# Altium footprint library CustomCase.PcbLib: 268 footprints (part 6 of 17)
Each footprint in its own frame and in the unit in brackets; x right, y up, seen from the top. Pads: shape width x height; smd on the part's side, far side on the other; paste and mask are expansions set on the pad; w line width, h text height; cw(c..) or ccw(c..) is an arc to the next point about the centre after c.
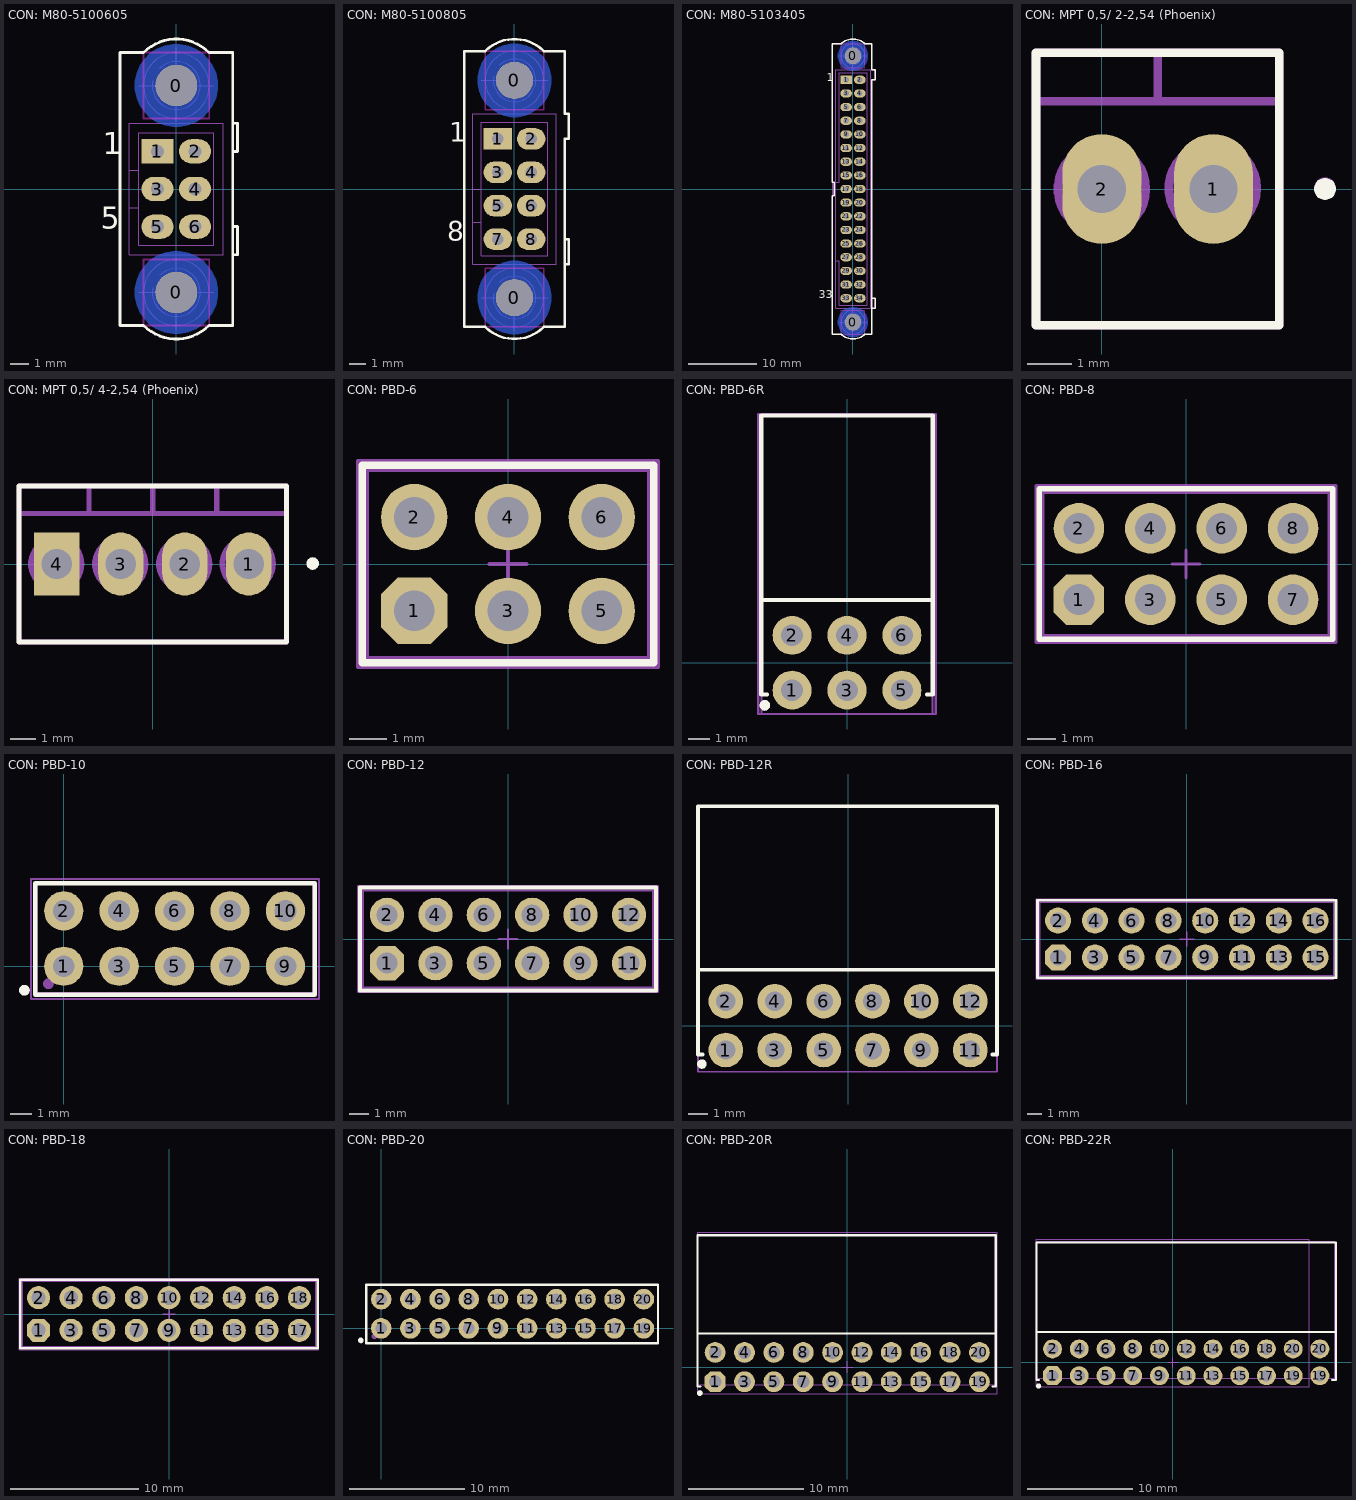
[diagram p5: the footprints below, top view; thin cyan lines are the x and y axes]

## CON: M80-5100605 [mm] "6 pin; Harwin"
height 5.5
pads (8):
  round 2.2 hole 2.2 unplated: 0(0,-5.5) 0(0,5.5)
  rect 1.7x1.3 hole 0.7: 1(-1,2)
  oval 1.7x1.3 hole 0.7: 2(1,2) 3(-1,0) 4(1,0) 5(-1,-2) 6(1,-2)
Top Layer keep-out:
  lines w0.1: -1.75,-7.25 1.75,-7.25 1.75,-3.75 -1.75,-3.75 -1.75,-7.25 ; -1.75,3.75 -1.75,7.25 1.75,7.25 1.75,3.75 -1.75,3.75
Bottom Layer:
  pour cut-out: 2.2,-5.5 2.2,-5.283 2.115,-4.858 1.95,-4.458 1.709,-4.098 1.402,-3.791 1.042,-3.55 0.642,-3.385 0.217,-3.3 -0.217,-3.3 -0.642,-3.385 -1.042,-3.55 -1.402,-3.791 -1.709,-4.098 -1.95,-4.458 -2.115,-4.858 -2.2,-5.283 -2.2,-5.5 -2.2,-5.717 -2.115,-6.142 -1.95,-6.542 -1.709,-6.902 -1.402,-7.209 -1.042,-7.45 -0.642,-7.615 -0.217,-7.7 0.217,-7.7 0.642,-7.615 1.042,-7.45 1.402,-7.209 1.709,-6.902 1.95,-6.542 2.115,-6.142 2.2,-5.717
  pour cut-out: 2.2,5.5 2.2,5.717 2.115,6.142 1.95,6.542 1.709,6.902 1.402,7.209 1.042,7.45 0.642,7.615 0.217,7.7 -0.217,7.7 -0.642,7.615 -1.042,7.45 -1.402,7.209 -1.709,6.902 -1.95,6.542 -2.115,6.142 -2.2,5.717 -2.2,5.5 -2.2,5.283 -2.115,4.858 -1.95,4.458 -1.709,4.098 -1.402,3.791 -1.042,3.55 -0.642,3.385 -0.217,3.3 0.217,3.3 0.642,3.385 1.042,3.55 1.402,3.791 1.709,4.098 1.95,4.458 2.115,4.858 2.2,5.283
Top Overlay:
  lines w0.15: 3,-4 3,4 ; 3,-2 3.25,-2 3.25,-3.5 3,-3.5 3,-7.25 1.75,-7.25 cw(c0,-5.5) -1.75,-7.25 -3,-7.25 -3,7.25 -1.75,7.25 cw(c0,5.5) 1.75,7.25 3,7.25 3,3.5 3.25,3.5 3.25,2 3,2
  text "5" at -4.027,-2.5 h2
  text "1" at -3.9,1.45 h2
Top Assy:
  circle w0.05: c0,-5.5 r1.75
  circle w0.05: c0,-5.5 r1
  circle w0.05: c0,5.5 r1.75
  circle w0.05: c0,5.5 r1
  circle w0.05: c-1,2 r0.25
  circle w0.05: c-1,0 r0.25
  circle w0.05: c-1,-2 r0.25
  circle w0.05: c-1,-2 r0.25
  circle w0.05: c1,-2 r0.25
  circle w0.05: c1,-2 r0.25
  circle w0.05: c1,0 r0.25
  circle w0.05: c1,2 r0.25
  circle w0.05: c1,2 r0.25
  circle w0.05: c-1,2 r0.25
  lines w0.05: -2,-5.5 2,-5.5 ; -2,5.5 2,5.5 ; -1.5,-5.5 1.5,-5.5 ; -1.25,-5.248 ccw(c0,-5.5) -0.901,-4.599 ; -1.25,5.752 ccw(c0,5.5) -0.901,6.401 ; 0,-7.5 0,-3.65 ; 0,3.6 0,7.5 ; 3,-4 3,-2 ; 3,2 3.25,2 3.25,3.5 3,3.5 3,7.25 1.75,7.25 ccw(c0,5.5) -1.75,7.25 -3,7.25 -3,-2 -3,-7.25 -1.75,-7.25 ccw(c0,-5.5) 1.75,-7.25 3,-7.25 3,-3.5 3.25,-3.5 ; 3,4 3,-2 ; -2.5,-1 -2,-1 ; -2.5,-1 -2.5,1 -2,1 ; -2.5,-1 -2.5,-3.5 0,-3.5 2.5,-3.5 2.5,-2 2.5,3.5 -2.5,3.5 -2.5,-1 ; -2,-1 -2,1 ; -2,-1 -2,3 2,3 2,-2 2,-3 -2,-3 -2,1 ; 3,-2 3.25,-2 ; 3.25,-3.5 3.25,-2 ; 3.25,-3.5 3.25,-2
3D body "m80-5100605_asm.stp": height 5.6, standoff -4.6, extent -2.775,-8 3.275,8

## CON: M80-5100805 [mm] "8 pin"
height 5.5
pads (10):
  round 2.2 hole 2.2 unplated: 0(0,-6.5) 0(0,6.5)
  rect 1.7x1.3 hole 0.7: 1(-1,3)
  oval 1.7x1.3 hole 0.7: 2(1,3) 3(-1,1) 4(1,1) 5(-1,-1) 6(1,-1) 7(-1,-3) 8(1,-3)
Top Layer keep-out:
  lines w0.1: -1.75,-8.25 1.75,-8.25 1.75,-4.75 -1.75,-4.75 -1.75,-8.25 ; -1.75,4.75 -1.75,8.25 1.75,8.25 1.75,4.75 -1.75,4.75
Bottom Layer:
  pour cut-out: 2.2,-6.5 2.2,-6.283 2.116,-5.858 1.95,-5.458 1.709,-5.098 1.403,-4.791 1.042,-4.55 0.642,-4.385 0.217,-4.3 -0.216,-4.3 -0.641,-4.385 -1.042,-4.55 -1.402,-4.791 -1.709,-5.098 -1.949,-5.458 -2.115,-5.858 -2.2,-6.283 -2.2,-6.5 -2.2,-6.717 -2.115,-7.142 -1.949,-7.542 -1.709,-7.902 -1.402,-8.209 -1.042,-8.45 -0.641,-8.615 -0.216,-8.7 0.217,-8.7 0.642,-8.615 1.042,-8.45 1.403,-8.209 1.709,-7.902 1.95,-7.542 2.116,-7.142 2.2,-6.717
  pour cut-out: 2.2,6.5 2.2,6.717 2.116,7.142 1.95,7.542 1.709,7.902 1.403,8.209 1.042,8.45 0.642,8.615 0.217,8.7 -0.216,8.7 -0.641,8.615 -1.042,8.45 -1.402,8.209 -1.709,7.902 -1.949,7.542 -2.115,7.142 -2.2,6.717 -2.2,6.5 -2.2,6.283 -2.115,5.858 -1.949,5.458 -1.709,5.098 -1.402,4.791 -1.042,4.55 -0.641,4.385 -0.216,4.3 0.217,4.3 0.642,4.385 1.042,4.55 1.403,4.791 1.709,5.098 1.95,5.458 2.116,5.858 2.2,6.283
Top Overlay:
  lines w0.15: 3,-5 3,3 3.25,3 3.25,4.5 3,4.5 3,8.25 1.75,8.25 ccw(c0,6.5) -1.75,8.25 -3,8.25 -3,-8.25 -1.75,-8.25 ccw(c0,-6.5) 1.75,-8.25 3,-8.25 3,-4.5 3.25,-4.5 3.25,-3 3,-3
  text "8" at -4.027,-3.5 h2
  text "1" at -3.9,2.45 h2
Top Assy:
  circle w0.05: c0,-6.5 r1.75
  circle w0.05: c0,-6.5 r1
  circle w0.05: c0,6.5 r1.75
  circle w0.05: c0,6.5 r1
  circle w0.05: c-1,1 r0.25
  circle w0.05: c-1,-1 r0.25
  circle w0.05: c-1,-3 r0.25
  circle w0.05: c-1,-3 r0.25
  circle w0.05: c1,-3 r0.25
  circle w0.05: c1,-3 r0.25
  circle w0.05: c1,-1 r0.25
  circle w0.05: c1,1 r0.25
  circle w0.05: c1,3 r0.25
  circle w0.05: c-1,3 r0.25
  lines w0.05: -2,-6.5 2,-6.5 ; -2,6.5 2,6.5 ; -1.5,-6.5 1.5,-6.5 ; -1.249,-6.248 ccw(c0,-6.5) -0.901,-5.599 ; -1.249,6.752 ccw(c0,6.5) -0.901,7.401 ; 0,-8.5 0,-4.65 ; 0,4.6 0,8.5 ; 3,-5 3,-3 ; -2.5,-2 -2,-2 ; -2.5,-2 -2.5,0 -2,0 ; -2.5,-2 -2.5,-4.5 0,-4.5 2.5,-4.5 2.5,-3 2.5,4.5 -2.5,4.5 -2.5,-2 ; -2,-2 -2,0 ; -2,-2 -2,4 2,4 2,-3 2,-4 -2,-4 -2,0 ; 3,-3 3.25,-3 ; 3,-3 3,3 3.25,3 3.25,4.5 3,4.5 3,8.25 1.75,8.25 ccw(c0,6.5) -1.75,8.25 -3,8.25 -3,-3 -3,-8.25 -1.75,-8.25 ccw(c0,-6.5) 1.75,-8.25 3,-8.25 3,-4.5 3.25,-4.5 ; 3.25,-4.5 3.25,-3 ; 3.25,-4.5 3.25,-3
3D body "m80-5100805_asm.stp": height 5.6, standoff -4.6, extent -2.775,-9 3.275,9

## CON: M80-5103405 [mm] "26pin; screw; Harwin"
height 5.6
pads (36):
  round 2.4 hole 2.4 unplated mask+0.1: 0(0,-19.5) 0(0,19.5)
  rect 1.7x1.2 hole 0.8: 1(-1,16)
  oval 1.7x1.2 hole 0.8: 2(1,16) 3(-1,14) 4(1,14) 5(-1,12) 6(1,12) 7(-1,10) 8(1,10) 9(-1,8) 10(1,8) 11(-1,6) 12(1,6) 13(-1,4) 14(1,4) 15(-1,2) 16(1,2) 17(-1,0) 18(1,0) 19(-1,-2) 20(1,-2) 21(-1,-4) 22(1,-4) 23(-1,-6) 24(1,-6) 25(-1,-8) 26(1,-8) 27(-1,-10) 28(1,-10) 29(-1,-12) 30(1,-12) 31(-1,-14) 32(1,-14) 33(-1,-16) 34(1,-16)
Top Layer keep-out:
  lines w0.1: -1.75,-21.25 -1.75,-17.75 1.75,-17.75 1.75,-21.25 -1.75,-21.25 ; -1.75,17.75 -1.75,21.25 1.75,21.25 1.75,17.75 -1.75,17.75
Bottom Layer:
  pour cut-out: 2.2,19.5 2.2,19.717 2.115,20.142 1.95,20.542 1.709,20.902 1.402,21.209 1.042,21.45 0.642,21.615 0.217,21.7 -0.217,21.7 -0.642,21.615 -1.042,21.45 -1.402,21.209 -1.709,20.902 -1.95,20.542 -2.115,20.142 -2.2,19.717 -2.2,19.5 -2.2,19.283 -2.115,18.858 -1.95,18.458 -1.709,18.098 -1.402,17.791 -1.042,17.55 -0.642,17.385 -0.217,17.3 0.217,17.3 0.642,17.385 1.042,17.55 1.402,17.791 1.709,18.098 1.95,18.458 2.115,18.858 2.2,19.283
  pour cut-out: 2.2,-19.5 2.2,-19.283 2.115,-18.858 1.95,-18.458 1.709,-18.098 1.402,-17.791 1.042,-17.55 0.642,-17.385 0.217,-17.3 -0.217,-17.3 -0.642,-17.385 -1.042,-17.55 -1.402,-17.791 -1.709,-18.098 -1.95,-18.458 -2.115,-18.858 -2.2,-19.283 -2.2,-19.5 -2.2,-19.717 -2.115,-20.142 -1.95,-20.542 -1.709,-20.902 -1.402,-21.209 -1.042,-21.45 -0.642,-21.615 -0.217,-21.7 0.217,-21.7 0.642,-21.615 1.042,-21.45 1.402,-21.209 1.709,-20.902 1.95,-20.542 2.115,-20.142 2.2,-19.717
Top Overlay:
  lines w0.2: 2.75,-16 3.25,-16 3.25,-17.5 2.75,-17.5 2.75,-21.25 ; -1.75,21.25 cw(c0,19.5) 1.75,21.25 2.75,21.25 ; -1.75,21.25 -1.75,21.25 ; -1.75,21.25 -3,21.25 -3,1 -2.75,1 -2.75,-1 -3,-1 -3,-21.25 -1.75,-21.25 ccw(c0,-19.5) 1.75,-21.25 2.75,-21.25 ; 2.75,-21.25 2.75,16 3.25,16 3.25,17.5 2.75,17.5 2.75,21.25 ; 2.75,21.25 2.75,21.25
  text "33" at -5,-16.425 h2
  text "1" at -3.85,15.375 h2
Top Assy:
  circle w0.05: c-1,-2 r0.25
  circle w0.05: c1,-2 r0.25
  circle w0.05: c-1.042,6 r0.25
  circle w0.05: c-1.042,8 r0.25
  circle w0.05: c-1,-4 r0.25
  circle w0.05: c0.958,6 r0.25
  circle w0.05: c0.958,8 r0.25
  circle w0.05: c1,-4 r0.25
  circle w0.05: c0,19.5 r1.75
  circle w0.05: c0,-19.5 r1.75
  circle w0.05: c0,19.5 r1
  circle w0.05: c0,-19.5 r1
  circle w0.05: c1,-16 r0.25
  circle w0.05: c-1,-16 r0.25
  circle w0.05: c1,-14 r0.25
  circle w0.05: c-1,-14 r0.25
  circle w0.05: c-1,14 r0.25
  circle w0.05: c-1,12 r0.25
  circle w0.05: c-1,10 r0.25
  circle w0.05: c-1,4 r0.25
  circle w0.05: c-1,2 r0.25
  circle w0.05: c-1,0 r0.25
  circle w0.05: c-1,-12 r0.25
  circle w0.05: c1,-12 r0.25
  circle w0.05: c1,0 r0.25
  circle w0.05: c1,2 r0.25
  circle w0.05: c1,4 r0.25
  circle w0.05: c1,10 r0.25
  circle w0.05: c1,12 r0.25
  circle w0.05: c1,14 r0.25
  circle w0.05: c1,16 r0.25
  circle w0.05: c-1,16 r0.25
  circle w0.05: c1,-6 r0.25
  circle w0.05: c-1,-6 r0.25
  circle w0.05: c1,-8 r0.25
  circle w0.05: c-1,-8 r0.25
  circle w0.05: c1,-10 r0.25
  circle w0.05: c-1,-10 r0.25
  lines w0.05: -2.5,-10.5 -2,-10.5 -2,-17 2,-17 2,17 -2,17 -2,1 -2.5,1 ; -2,-19.5 2,-19.5 ; -2,19.5 2,19.5 ; -1.5,-19.5 1.5,-19.5 ; -1.25,-19.248 ccw(c0,-19.5) -0.901,-18.599 ; -1.25,19.752 ccw(c0,19.5) -0.901,20.401 ; 0,-21.5 0,-17.65 ; 0,17.6 0,21.5 ; 2.75,-16 3.25,-16 3.25,-17.5 2.75,-17.5 2.75,-21.25 ; 2.75,-21.25 1.75,-21.25 cw(c0,-19.5) -1.75,-21.25 -3,-21.25 -3,21.25 -1.75,21.25 cw(c0,19.5) 1.75,21.25 2.75,21.25 2.75,17.5 3.25,17.5 3.25,16 2.75,16 2.75,-21.25 ; -2.5,-17.5 2.5,-17.5 2.5,17.5 -2.5,17.5 -2.5,-17.5
3D body "m80-5103405_asm.stp": height 5.6, standoff -4.6, extent -3.025,-22 3.025,22

## CON: MPT 0,5/ 2-2,54 (Phoenix) [mm] "1725656; 2.54; 2pin"
height 8.5
pads (4):
  oval 1.8x2.5 hole 1.1: 1(2.54,0) 2(0,0)
  round 0.5 on Top Overlay: ""(5.08,0)
  round 0.5 on Mech1: ""(5.08,0.018)
Top Overlay:
  lines w0.2: -1.5,-3.1 -1.5,3.1 4.04,3.1 4.04,-3.1 -1.5,-3.1
Top Assy:
  circle w0.2: c2.524,0.018 r1
  circle w0.2: c0,0 r1
  lines w0.2: -1.5,2 4.04,2 ; -0.8,-0.6 0.752,0.564 ; 1.27,2 1.27,3.1 ; 1.724,-0.582 3.276,0.582 ; -1.5,-3.1 -1.5,3.1 4.04,3.1 4.04,-3.1 -1.5,-3.1
3D body "pxc_1725656_05_MPT-0-5-2-2-54_3D.stp": height 8.5, standoff -3.5, extent -1.5,-3.1 4.04,3.1

## CON: MPT 0,5/ 4-2,54 (Phoenix) [mm] "1725672; 2.54; 4pin"
height 8.5
pads (8):
  oval 1.8x2.5 hole 1.2: 1(3.81,0) 2(1.27,0) 3(-1.27,0)
  rect 1.8x2.5 hole 1.2: 4(-3.81,0)
  round 0.5 on Mech1: ""(-3.81,0)
  round 0.5 on Bottom Overlay: ""(-0.97,0) ""(-0.93,0)
  round 0.5 on Top Overlay: ""(6.35,0.018)
Top Overlay:
  lines w0.2: -5.31,-3.1 -5.31,3.1 5.31,3.1 5.31,-3.1 -5.31,-3.1
Top Assy:
  circle w0.2: c-3.81,0 r1
  circle w0.2: c-3.85,0 r1
  circle w0.2: c-1.27,0 r1
  circle w0.2: c-1.31,0 r1
  circle w0.2: c1.23,0 r1
  circle w0.2: c3.754,0.018 r1
  circle w0.2: c3.794,0.018 r1
  circle w0.2: c1.27,0 r1
  lines w0.2: -5.31,2 5.31,2 ; -4.65,-0.6 -3.098,0.564 ; -4.61,-0.6 -3.058,0.564 ; -2.54,2 -2.54,3.1 ; -2.11,-0.6 -0.558,0.564 ; -2.07,-0.6 -0.518,0.564 ; 0,2 0,3.1 ; 0.43,-0.6 1.982,0.564 ; 0.47,-0.6 2.022,0.564 ; 2.54,2 2.54,3.1 ; 2.954,-0.582 4.506,0.582 ; 2.994,-0.582 4.546,0.582 ; -5.31,-3.1 -5.31,3.1 ; -5.31,-3.1 -5.31,3.1 ; -5.31,-3.1 5.31,-3.1 5.31,3.1 -5.31,3.1
3D body "pxc_1725672_05_MPT-0-5-4-2-54_3D.stp": height 8.5, standoff -3.5, extent -5.31,-3.082 5.31,3.118

## CON: PBD-6 [mm] "PBD-6"
height 10
pads (6):
  oct 1.8x1.8 hole 1.1: 1(-2.54,-1.27)
  round 1.8 hole 1.1: 2(-2.54,1.27) 3(0,-1.27) 4(0,1.27) 5(2.54,-1.27) 6(2.54,1.27)
Top Overlay:
  lines w0.2: -3.95,-2.675 -3.95,2.675 3.95,2.675 3.95,-2.675 -3.95,-2.675
Top Assy:
  lines w0.1: -3.81,-2.54 -3.81,2.54 3.81,2.54 3.81,-2.54 -3.81,-2.54
Size Area:
  lines w0.1: -0.5,0 0.5,0 ; 0,-0.5 0,0.5 ; -4.064,-2.794 4.064,-2.794 4.064,2.794 -4.064,2.794 -4.064,-2.794
3D body "PBD-6.STEP": height 8.5, standoff -3, extent -3.81,-2.54 3.81,2.54

## CON: PBD-6R [mm]
pads (8):
  round 1.8 hole 1: 1(-2.54,-1.27) 2(-2.54,1.27) 3(0,-1.27) 4(0,1.27) 5(2.54,-1.27) 6(2.54,1.27)
  round 0.5 on Mech1: ""(-3.8,-1.97)
  round 0.5 on Top Overlay: ""(-3.8,-1.97)
Top Overlay:
  lines w0.2: -3.96,2.9 3.96,2.9 ; -3.7,-1.47 -3.96,-1.47 -3.96,11.43 3.96,11.43 3.96,-1.47 3.7,-1.47
Top Assy:
  lines w0.1: -3.96,-2.37 -3.96,11.43 3.96,11.43 3.96,-2.37 -3.96,-2.37
Size Area:
  lines w0.1: -4.1,-2.37 -4.1,11.5 4.1,11.5 4.1,-2.37 -4.1,-2.37
3D body "PLD-2x3.STEP": height 5.02, standoff -3.48, extent -3.96,-1.47 3.96,11.43

## CON: PBD-8 [mm] "PBD-8"
height 10
pads (8):
  oct 1.8x1.8 hole 1.1: 1(-3.81,-1.27)
  round 1.8 hole 1.1: 2(-3.81,1.27) 3(-1.27,-1.27) 4(-1.27,1.27) 5(1.27,-1.27) 6(1.27,1.27) 7(3.81,-1.27) 8(3.81,1.27)
Top Overlay:
  lines w0.2: -5.225,-2.675 -5.225,2.675 5.225,2.675 5.225,-2.675 -5.225,-2.675
Top Assy:
  lines w0.1: -5.08,-2.54 -5.08,2.54 5.08,2.54 5.08,-2.54 -5.08,-2.54
Size Area:
  lines w0.1: -0.5,0 0.5,0 ; 0,-0.5 0,0.5 ; -5.334,-2.794 5.334,-2.794 5.334,2.794 -5.334,2.794 -5.334,-2.794
3D body "PBD-8.STEP": height 8.5, standoff -3, extent -5.08,-2.54 5.08,2.54

## CON: PBD-10 [mm]
pads (12):
  round 1.8 hole 1: 1(0,0) 2(0,2.54) 3(2.54,0) 4(2.54,2.54) 5(5.08,0) 6(5.08,2.54) 7(7.62,0) 8(7.62,2.54) 9(10.16,0) 10(10.16,2.54)
  round 0.5 on Top Overlay: ""(-1.8,-1.1)
  round 0.5 on Mech1: ""(-0.7,-0.8)
Top Overlay:
  lines w0.2: -1.3,-1.3 11.5,-1.3 11.5,3.8 -1.3,3.8 -1.3,-1.3
Top Assy:
  lines w0.1: -1.25,-1.24 -1.25,3.84 11.45,3.84 11.45,-1.24 -1.25,-1.24
Size Area:
  lines w0.1: -1.5,-1.5 11.7,-1.5 11.7,4 -1.5,4 -1.5,-1.5
3D body "User Library-PBD2_54-10.STEP": height 8.4, standoff -2.7, extent -1.25,-1.24 11.45,3.84

## CON: PBD-12 [mm] "PBD-12"
height 10
pads (12):
  oct 1.8x1.8 hole 1.1: 1(-6.35,-1.27)
  round 1.8 hole 1.1: 2(-6.35,1.27) 3(-3.81,-1.27) 4(-3.81,1.27) 5(-1.27,-1.27) 6(-1.27,1.27) 7(1.27,-1.27) 8(1.27,1.27) 9(3.81,-1.27) 10(3.81,1.27) 11(6.35,-1.27) 12(6.35,1.27)
Top Overlay:
  lines w0.2: -7.775,-2.7 7.775,-2.7 7.775,2.7 -7.775,2.7 -7.775,-2.7
Top Assy:
  lines w0.1: -7.62,-2.54 7.62,-2.54 7.62,2.54 -7.62,2.54 -7.62,-2.54
Size Area:
  lines w0.1: -0.5,0 0.5,0 ; 0,-0.5 0,0.5 ; -7.874,-2.794 -7.874,2.794 7.874,2.794 7.874,-2.794 -7.874,-2.794
3D body "PBD-6.STEP": height 8.5, standoff -3, extent -7.61,-2.54 0.01,2.54
3D body "PBD-6.STEP": height 8.5, standoff -3, extent -0.01,-2.54 7.61,2.54

## CON: PBD-12R [mm]
pads (13):
  round 1.8 hole 1: 1(-6.35,-1.27) 2(-6.35,1.27) 3(-3.81,-1.27) 4(-3.81,1.27) 5(-1.27,-1.27) 6(-1.27,1.27) 7(1.27,-1.27) 8(1.27,1.27) 9(3.81,-1.27) 10(3.81,1.27) 11(6.35,-1.27) 12(6.35,1.27)
  round 0.5 on Top Overlay: ""(-7.6,-2)
Top Overlay:
  lines w0.2: -7.8,2.9 7.74,2.9 ; -7.56,-1.5 -7.8,-1.5 -7.8,11.4 7.74,11.4 7.74,-1.5 7.5,-1.5
Top Assy:
  lines w0.1: -7.8,-2.4 -7.8,11.4 7.74,11.4 7.74,-2.4 -7.8,-2.4
Size Area:
  lines w0.1: -7.8,-2.4 -7.8,11.4 7.74,11.4 7.74,-2.4 -7.8,-2.4
3D body "PLD-2x6R.STEP": height 5.02, standoff -3.48, extent -7.8,-1.5 7.74,11.4

## CON: PBD-16 [mm] "PBD-16"
height 10
pads (16):
  oct 1.8x1.8 hole 1.1: 1(-8.89,-1.27)
  round 1.8 hole 1.1: 2(-8.89,1.27) 3(-6.35,-1.27) 4(-6.35,1.27) 5(-3.81,-1.27) 6(-3.81,1.27) 7(-1.27,-1.27) 8(-1.27,1.27) 9(1.27,-1.27) 10(1.27,1.27) 11(3.81,-1.27) 12(3.81,1.27) 13(6.35,-1.27) 14(6.35,1.27) 15(8.89,-1.27) 16(8.89,1.27)
Top Overlay:
  lines w0.2: -10.3,-2.675 -10.3,2.675 10.3,2.675 10.3,-2.675 -10.3,-2.675
Top Assy:
  lines w0.1: -10.16,-2.54 -10.16,2.54 10.15,2.54 10.15,-2.54 -10.16,-2.54
Size Area:
  lines w0.05: -10.414,-2.794 10.15,-2.794 10.15,2.794 -10.414,2.794 -10.414,-2.794
  lines w0.1: -0.5,0 0.5,0 ; 0,-0.5 0,0.5
3D body "PBD-16.STEP": height 8.5, standoff -3, extent -10.16,-2.54 10.16,2.54

## CON: PBD-18 [mm] "PBD-18"
height 10
pads (18):
  oct 1.8x1.8 hole 1.1: 1(-10.16,-1.27)
  round 1.8 hole 1.1: 2(-10.16,1.27) 3(-7.62,-1.27) 4(-7.62,1.27) 5(-5.08,-1.27) 6(-5.08,1.27) 7(-2.54,-1.27) 8(-2.54,1.27) 9(0,-1.27) 10(0,1.27) 11(2.54,-1.27) 12(2.54,1.27) 13(5.08,-1.27) 14(5.08,1.27) 15(7.62,-1.27) 16(7.62,1.27) 17(10.16,-1.27) 18(10.16,1.27)
Top Overlay:
  lines w0.2: -11.575,-2.675 -11.575,2.675 11.575,2.675 11.575,-2.675 -11.575,-2.675
Top Assy:
  lines w0.1: -11.43,-2.54 -11.43,2.54 11.43,2.54 11.43,-2.54 -11.43,-2.54
Size Area:
  lines w0.05: -11.684,-2.794 11.684,-2.794 11.684,2.794 -11.684,2.794 -11.684,-2.794
  lines w0.1: -0.5,0 0.5,0 ; 0,-0.5 0,0.5
3D body "PBD-18.STEP": height 8.5, standoff -3, extent -11.43,-2.54 11.43,2.54

## CON: PBD-20 [mm]
pads (22):
  round 1.8 hole 1: 1(0,0) 2(0,2.54) 3(2.54,0) 4(2.54,2.54) 5(5.08,0) 6(5.08,2.54) 7(7.62,0) 8(7.62,2.54) 9(10.16,0) 10(10.16,2.54) 11(12.7,0) 12(12.7,2.54) 13(15.24,0) 14(15.24,2.54) 15(17.78,0) 16(17.78,2.54) 17(20.32,0) 18(20.32,2.54) 19(22.86,0) 20(22.86,2.54)
  round 0.5 on Top Overlay: ""(-1.775,-1.05)
  round 0.5 on Mech1: ""(-0.6,-0.7)
Top Overlay:
  lines w0.2: -1.3,-1.3 -1.3,3.8 24.1,3.8 24.1,-1.3 -1.3,-1.3
Top Assy:
  lines w0.1: -1.3,-1.3 24.1,-1.3 24.1,3.78 -1.3,3.78 -1.3,-1.3
Size Area:
  lines w0.1: -1.3,-1.3 24.1,-1.3 24.1,3.8 -1.3,3.8 -1.3,-1.3
3D body "User Library-PBD2_54-20.STEP": height 8.4, standoff -2.7, extent -1.3,-1.3 24.1,3.78

## CON: PBD-20R [mm] "PBD-20R"
height 10
pads (21):
  oct 1.8x1.8 hole 1.1: 1(-11.43,-1.27)
  round 1.8 hole 1.1: 2(-11.43,1.27) 3(-8.89,-1.27) 4(-8.89,1.27) 5(-6.35,-1.27) 6(-6.35,1.27) 7(-3.81,-1.27) 8(-3.81,1.27) 9(-1.27,-1.27) 10(-1.27,1.27) 11(1.27,-1.27) 12(1.27,1.27) 13(3.81,-1.27) 14(3.81,1.27) 15(6.35,-1.27) 16(6.35,1.27) 17(8.89,-1.27) 18(8.89,1.27) 19(11.43,-1.27) 20(11.43,1.27)
  round 0.5 on Top Overlay: ""(-12.75,-2.25)
Top Overlay:
  lines w0.2: -12.85,2.9 12.85,2.9 ; -12.7,-1.675 -12.954,-1.675 -12.954,11.4 12.85,11.4 12.85,-1.675 12.575,-1.675
Top Assy:
  lines w0.1: -12.954,-1.525 -12.954,11.506 12.85,11.506 12.85,-1.525 -12.954,-1.525
Size Area:
  lines w0.05: -12.954,-2.325 12.954,-2.325 12.954,11.684 -12.954,11.684 -12.954,-2.325
  lines w0.1: -0.5,0 0.5,0 ; 0,-0.5 0,0.5
3D body "PBD-20R.STEP": height 5, standoff -3, extent -12.7,-1.524 12.7,11.496

## CON: PBD-22R [mm] "PBD-22R"
height 10
pads (23):
  oct 1.8x1.8 hole 1.1: 1(-11.43,-1.27)
  round 1.8 hole 1.1: 2(-11.43,1.27) 3(-8.89,-1.27) 4(-8.89,1.27) 5(-6.35,-1.27) 6(-6.35,1.27) 7(-3.81,-1.27) 8(-3.81,1.27) 9(-1.27,-1.27) 10(-1.27,1.27) 11(1.27,-1.27) 12(1.27,1.27) 13(3.81,-1.27) 14(3.81,1.27) 15(6.35,-1.27) 16(6.35,1.27) 17(8.89,-1.27) 18(8.89,1.27) 19(11.43,-1.27) 19(13.97,-1.27) 20(11.43,1.27) 20(13.97,1.27)
  round 0.5 on Top Overlay: ""(-12.75,-2.25)
Top Overlay:
  lines w0.2: -12.85,2.9 15.5,2.9 ; -12.7,-1.675 -12.954,-1.675 -12.954,11.4 15.5,11.4 15.5,-1.675 15.39,-1.675 15.115,-1.675
Top Assy:
  lines w0.1: 15.39,-1.525 -12.954,-1.525 -12.954,11.506 15.39,11.506 ; 15.39,-1.525 15.39,11.506 ; 15.39,-1.525 15.39,11.506
Size Area:
  lines w0.05: -12.954,-2.325 -12.954,11.684 12.954,11.684 12.954,-2.325 -12.954,-2.325
  lines w0.1: -0.5,0 0.5,0 ; 0,-0.5 0,0.5
3D body "PBD-20R.STEP": height 5, standoff -3, extent -12.7,-1.524 12.7,11.496